# Altium footprint library NX Module baseboard.PcbLib: 96 footprints (part 6 of 6)
Each footprint in its own frame and in the unit in brackets; x right, y up, seen from the top. Pads: shape width x height; smd on the part's side, far side on the other; paste and mask are expansions set on the pad; w line width, h text height; cw(c..) or ccw(c..) is an arc to the next point about the centre after c.
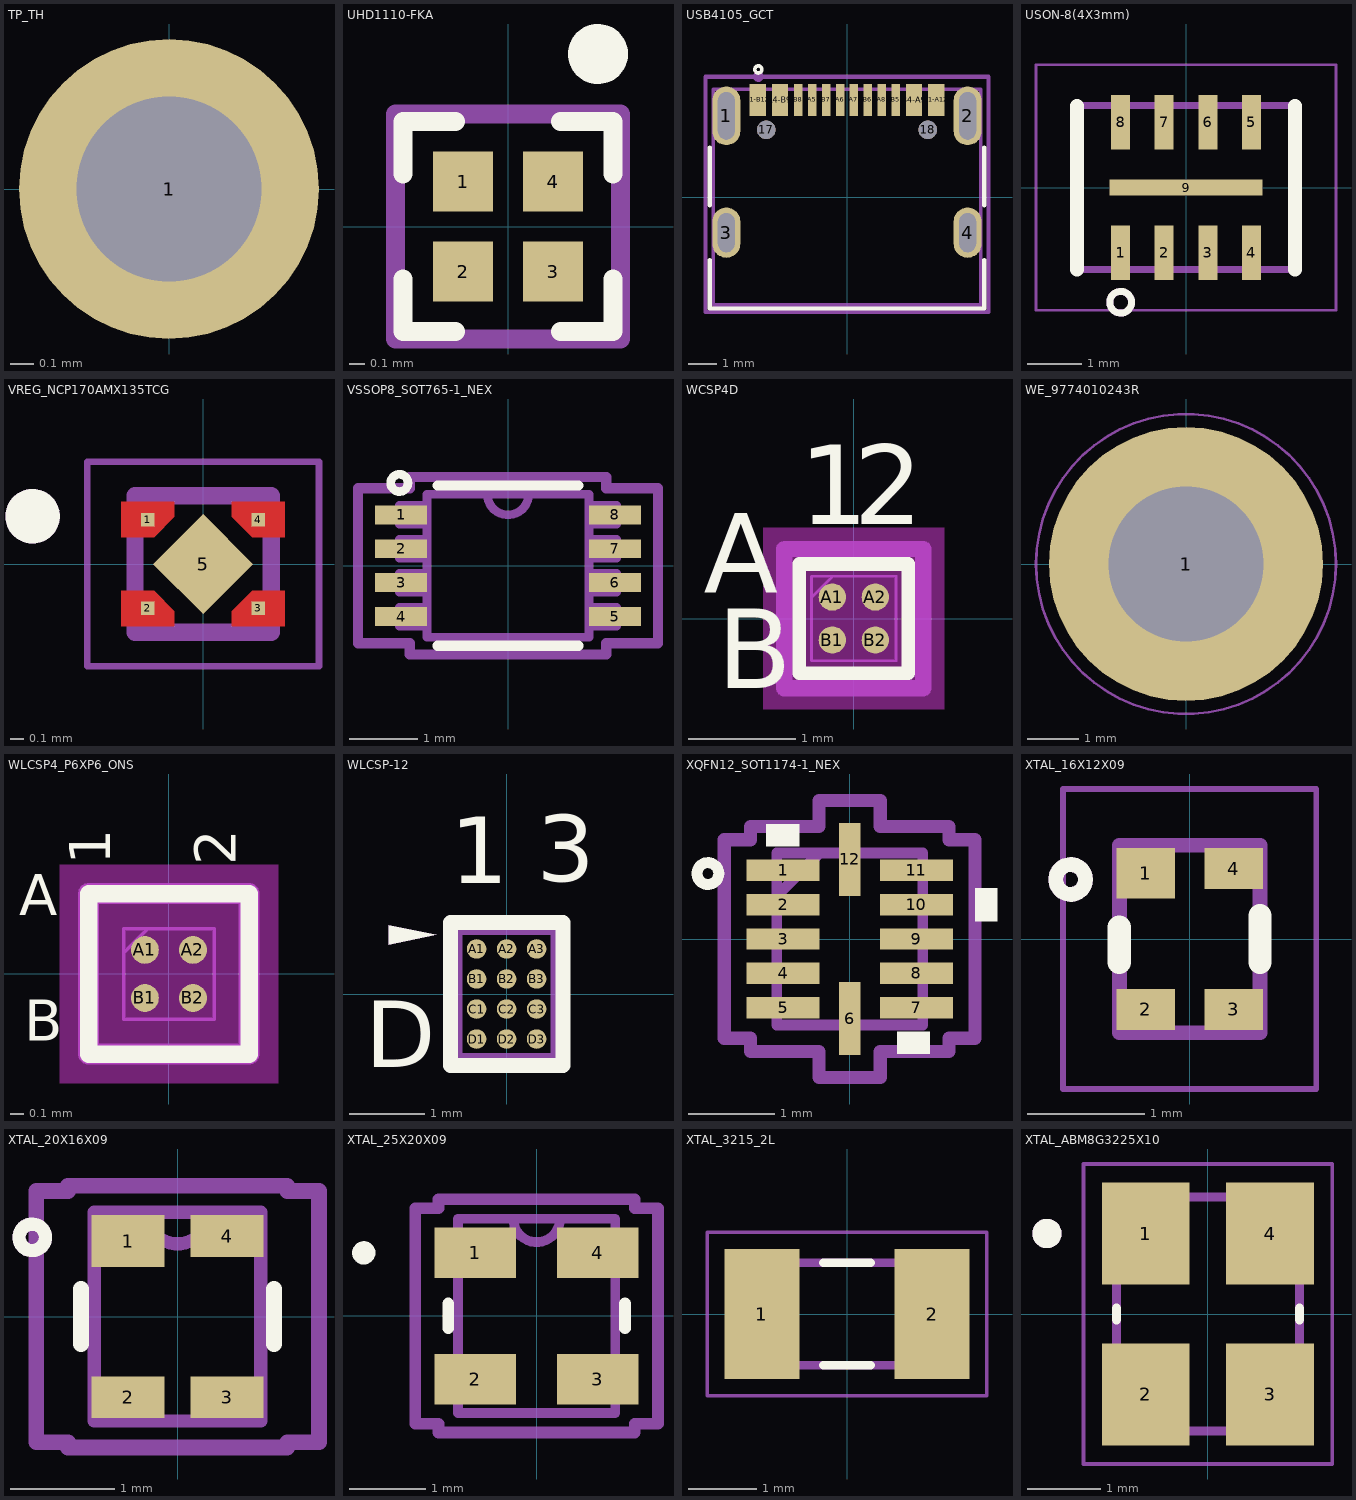
[diagram p5: the footprints below, top view; thin cyan lines are the x and y axes]

## TP_TH [mm] "1 mm Probe Pad"
pads (1):
  round 1.3 hole 0.8: 1(0,0)

## UHD1110-FKA [mm]
pads (4):
  rect 0.4x0.4 smd: 1(-0.3,0.3) 2(-0.3,-0.3) 3(0.3,-0.3) 4(0.3,0.3)
Top Overlay:
  circle w0.2: c0.6,1.15 r0.1
  lines w0.127: -0.7,-0.35 -0.7,-0.7 -0.35,-0.7 ; -0.7,0.35 -0.7,0.7 -0.35,0.7 ; 0.35,-0.7 0.7,-0.7 0.7,-0.35 ; 0.35,0.7 0.7,0.7 0.7,0.35
Mechanical 13:
  lines w0.127: -0.75,-0.75 -0.75,0.75 0.75,0.75 0.75,-0.75 -0.75,-0.75
  text ".Designator" at -0.55,-0.35 h1.27
3D body "UHD1110-FKA-CL1A13R3Q1BBQFMF3--3DModel-STEP-56544.STEP": height 0.7, standoff 0, extent -0.5,-0.5 0.5,0.5

## USB4105_GCT [mm]
pads (18):
  oval 1x2.1 hole 0.6 slot 1.7 at 90 deg mask+0.051: 1(-4.32,2.911) 2(4.32,2.911)
  oval 1x1.8 hole 0.6 slot 1.4 at 90 deg mask+0.051: 3(-4.32,-1.269) 4(4.32,-1.269)
  round 0.66 hole 0.66 unplated mask+0.051: 17(-2.89,2.411) 18(2.89,2.411)
  rect 0.584x1.143 smd mask+0.051: A1-B12(-3.2,3.486) A4-B9(-2.4,3.486) B1-A12(3.2,3.486) B4-A9(2.4,3.486)
  rect 0.305x1.143 smd paste+0 mask+0: A5(-1.25,3.486) A6(-0.25,3.486) A7(0.25,3.486) A8(1.25,3.486) B5(1.75,3.486) B6(0.75,3.486) B7(-0.75,3.486) B8(-1.75,3.486)
Top Overlay:
  circle w0.127: c-3.175,4.572 r0.127
  lines w0.152: -4.915,-2.252 -4.915,-3.988 4.915,-3.988 4.915,-2.252 ; -4.915,-0.287 -4.915,1.776 ; 4.915,-0.287 4.915,1.776
Mechanical 13:
  circle w0.127: c-3.175,4.318 r0.127
  lines w0.127: -4.788,-3.861 4.788,-3.861 4.788,3.861 -4.788,3.861 -4.788,-3.861
  text ".Designator" at -0.605,-0.232 h1.27
Mechanical 15:
  lines w0.152: -5.069,-4.115 -5.069,4.311 5.069,4.311 5.069,-4.115 -5.069,-4.115
Multi-Layer:
  lines w0.61: -4.32,-1.663 -4.32,-0.875 ; -4.32,2.365 -4.32,3.457 ; 4.32,-1.663 4.32,-0.875 ; 4.32,2.365 4.32,3.457
3D body "USB4105--3DModel-STEP-56544.STEP": height 3.31, standoff -0.85, extent -4.79,-3.861 4.79,3.849

## USON-8(4X3mm) [mm]
pads (9):
  rect 0.35x1 smd mask+0.05: 1(-1.2,-1.2) 2(-0.4,-1.2) 3(0.4,-1.2) 4(1.2,-1.2) 5(1.2,1.2) 6(0.4,1.2) 7(-0.4,1.2) 8(-1.2,1.2)
  rect 2.8x0.3 smd mask+0.05: 9(0,0)
Top Overlay:
  circle w0.127: c-1.197,-2.105 r0.2
  lines w0.254: -2,-1.5 -2,1.5 ; 2,-1.5 2,1.5
Mechanical 13:
  circle w0.127: c-1.199,-2.105 r0.199
  lines w0.127: -2,-1.5 -2,1.5 2,1.5 2,-1.5 -2,-1.5
  text ".Designator" at -0.632,-0.311 h1.27
Mechanical 15:
  lines w0.05: -2.75,-2.25 -2.75,2.25 2.75,2.25 2.75,-2.25 -2.75,-2.25
3D body: height 0.6, standoff 0, extent -2,-1.5 2,1.5

## VREG_NCP170AMX135TCG [mm]
pads (5):
  rect 0.1x0.1 smd paste-1 mask+0: 1(-0.405,0.325) 2(-0.405,-0.325) 3(0.405,-0.325) 4(0.405,0.325)
  rect 0.52x0.52 smd rot 45 mask+0.051: 5(0,0)
Top Layer:
  region: -0.21,0.345 -0.36,0.195 -0.6,0.195 -0.6,0.455 -0.21,0.455
  region: -0.21,-0.345 -0.21,-0.455 -0.6,-0.455 -0.6,-0.195 -0.36,-0.195
  region: 0.6,-0.455 0.21,-0.455 0.21,-0.345 0.36,-0.195 0.6,-0.195
  region: 0.6,0.195 0.36,0.195 0.21,0.345 0.21,0.455 0.6,0.455
Top Overlay:
  circle w0.2: c-1.25,0.35 r0.1
Top Paste:
  region: -0.21,0.345 -0.36,0.195 -0.6,0.195 -0.6,0.455 -0.21,0.455
  region: -0.21,-0.345 -0.21,-0.455 -0.6,-0.455 -0.6,-0.195 -0.36,-0.195
  region: 0.6,-0.455 0.21,-0.455 0.21,-0.345 0.36,-0.195 0.6,-0.195
  region: 0.6,0.195 0.36,0.195 0.21,0.345 0.21,0.455 0.6,0.455
Top Solder:
  region: 0.635,-0.483 0.178,-0.483 0.178,-0.33 0.356,-0.152 0.635,-0.152
  region: -0.178,-0.33 -0.178,-0.483 -0.635,-0.483 -0.635,-0.152 -0.356,-0.152
  region: -0.178,0.33 -0.356,0.152 -0.635,0.152 -0.635,0.483 -0.178,0.483
  region: 0.635,0.145 0.363,0.145 0.178,0.33 0.178,0.483 0.635,0.483
Mechanical 13:
  circle w0.2: c-1.25,0.35 r0.1
  lines w0.127: -0.5,-0.5 -0.5,0.5 0.5,0.5 0.5,-0.5 -0.5,-0.5
  text ".Designator" at -0.084,-0.429 h1.27
Mechanical 15:
  lines w0.05: -0.85,-0.75 0.85,-0.75 0.85,0.75 -0.85,0.75 -0.85,-0.75
3D body "step_temp.STEP": height 0.38, standoff -0.05, extent -0.5,-0.5 0.5,0.5

## VSSOP8_SOT765-1_NEX [mil]
pads (8):
  rect 30x11 smd paste+0 mask+0: 1(-62,29.53) 2(-62,9.84) 3(-62,-9.84) 4(-62,-29.53) 5(62,-29.53) 6(62,-9.84) 7(62,9.84) 8(62,29.53)
Top Overlay:
  circle w5: c-63,48 r5
  lines w6: -40.68,-46.5 40.68,-46.5 ; -40.68,46.5 40.68,46.5
Mechanical 13:
  lines w5: -12,41.5 ccw(c0,41.5) 12,41.5 ; -63,-35.03 -63,-24.03 -47,-24.03 -47,-35.03 -63,-35.03 ; -63,-15.34 -63,-4.34 -47,-4.34 -47,-15.34 -63,-15.34 ; -63,4.34 -63,15.34 -47,15.34 -47,4.34 -63,4.34 ; -63,24.03 -63,35.03 -47,35.03 -47,24.03 -63,24.03 ; -47,-41.5 47,-41.5 47,41.5 -47,41.5 -47,-41.5 ; 47,-35.03 47,-24.03 63,-24.03 63,-35.03 47,-35.03 ; 47,-15.34 47,-4.34 63,-4.34 63,-15.34 47,-15.34 ; 47,4.34 47,15.34 63,15.34 63,4.34 47,4.34 ; 47,24.03 47,35.03 63,35.03 63,24.03 47,24.03
  text ".Designator" at -18.43,-16.71 h50
Mechanical 15:
  lines w6: -87,-45.03 -87,45.03 -57,45.03 -57,51.5 57,51.5 57,45.03 87,45.03 87,-45.03 57,-45.03 57,-51.5 -57,-51.5 -57,-45.03 -87,-45.03
3D body "VSSOP8_SOT765-1_NEX.step": height 39.09, standoff 0, extent -62.99,-41.5 62.99,41.5

## WCSP4D [mm]
pads (4):
  round 0.254 smd paste+0 mask+0: A1(-0.2,0.2) A2(0.2,0.2) B1(-0.2,-0.2) B2(0.2,-0.2)
Top Overlay:
  lines w0.127: -0.508,-0.508 0.508,-0.508 0.508,0.508 -0.508,0.508 -0.508,-0.508
  text "2" at 0,0.635 h1.27
  text "1" at -0.508,0.635 h1.27
  text "B" at -1.27,-0.889 h1.27
  text "A" at -1.397,0 h1.27
Bottom Overlay:
  text "2" at 0.648,0.648 h1.27
  text "1" at -0.254,0.635 h1.27
  text "B" at -0.762,-0.889 h1.27
  text "A" at -0.648,0 h1.27
Keep-Out Layer:
  region: -0.844,-0.844 -0.844,0.844 0.844,0.844 0.844,-0.844
Mechanical 13:
  lines w0.025: -0.394,0.194 -0.194,0.394 ; -0.394,-0.394 -0.394,0.394 0.394,0.394 0.394,-0.394 -0.394,-0.394
  text "2" at 0,0.762 h1.27
  text "1" at -0.508,0.762 h1.27
  text "B" at -1.27,-0.762 h1.27
  text "A" at -1.397,0.127 h1.27
  text ".Designator" at -0.889,-1.874 h1.52
Mechanical 15:
  lines w0.152: -0.648,-0.648 0.648,-0.648 0.648,0.648 -0.648,0.648 -0.648,-0.648
3D body "WCSP4D.STEP": height 0.55, standoff 0, extent -0.395,-0.395 0.395,0.395

## WE_9774010243R [mm]
pads (2):
  round 5.3 smd paste-4: 1(0,0)
  round 3 hole 3 unplated: ""(0,0)
Top Paste:
  drawing of 4 lines, arcs and shapes, not listed
Mechanical 13:
  circle w0.127: c0,0 r2.175
  text ".Designator" at -0.354,-0.15 h0.3
Mechanical 15:
  circle w0.05: c0,0 r2.9
3D body "9774010243R (rev1).stp": height 1.1, standoff -1.3, extent -2.175,-2.172 2.175,2.172

## WLCSP4_P6XP6_ONS [mm]
pads (4):
  round 0.203 smd paste+0 mask+0: A1(-0.175,0.175) A2(0.175,0.175) B1(-0.175,-0.175) B2(0.175,-0.175)
Top Overlay:
  lines w0.127: -0.584,-0.584 0.584,-0.584 0.584,0.584 -0.584,0.584 -0.584,-0.584
  text "A" at -1.091,0.33 h0.51
  text "B" at -1.054,-0.584 h0.51
  text "1" at -0.33,0.795 h0.51
  text "2" at 0.584,0.792 h0.51
Keep-Out Layer:
  region: -0.794,-0.794 -0.794,0.794 0.794,0.794 0.794,-0.794
Mechanical 13:
  lines w0.025: -0.33,0.155 -0.155,0.33 ; -0.33,-0.33 0.33,-0.33 0.33,0.33 -0.33,0.33 -0.33,-0.33
  text ".Designator" at -0.254,-0.159 h0.51
  text "A" at -0.762,0.127 h0.51
  text "B" at -0.762,-0.381 h0.51
  text "1" at -0.127,0.635 h0.51
  text "2" at 0.381,0.635 h0.51
Mechanical 15:
  lines w0.152: -0.584,-0.584 -0.584,0.584 0.584,0.584 0.584,-0.584 -0.584,-0.584
3D body: height 0.33, standoff 0, extent -0.33,-0.33 0.33,0.33

## WLCSP-12 [mm]
pads (12):
  round 0.26 smd mask+0.025: A1(-0.4,0.6) A2(0,0.6) A3(0.4,0.6) B1(-0.4,0.2) B2(0,0.2) B3(0.4,0.2) C1(-0.4,-0.2) C2(0,-0.2) C3(0.4,-0.2) D1(-0.4,-0.6) D2(0,-0.6) D3(0.4,-0.6)
Top Overlay:
  region: -0.938,0.787 -1.573,0.914 -1.573,0.66
  lines w0.2: -0.75,-0.95 0.75,-0.95 0.75,0.95 -0.75,0.95 -0.75,-0.95
  text "D" at -1.887,-1.266 h1.52
  text "1" at -0.75,1.186 h1.52
  text "3" at 0.4,1.208 h1.52
Mechanical 13:
  region: -0.938,0.787 -1.573,0.914 -1.573,0.66
  lines w0.127: -0.65,-0.85 0.65,-0.85 0.65,0.85 -0.65,0.85 -0.65,-0.85
  text ".Designator" at 0.381,-0.33 h1.27
  text "1" at -0.853,1.186 h1.52
  text "3" at 0.297,1.208 h1.52
  text "D" at -1.99,-1.266 h1.52
3D body: height 0.63, standoff 0, extent -0.65,-0.85 0.65,0.85

## XQFN12_SOT1174-1_NEX [mm]
pads (12):
  rect 0.85x0.25 smd paste+0 mask+0.051: 1(-0.775,0.8) 2(-0.775,0.4) 3(-0.775,0) 4(-0.775,-0.4) 5(-0.775,-0.8) 7(0.775,-0.8) 8(0.775,-0.4) 9(0.775,0) 10(0.775,0.4) 11(0.775,0.8)
  rect 0.25x0.85 smd paste+0 mask+0.051: 6(0,-0.927) 12(0,0.927)
Top Overlay:
  circle w0.127: c-1.651,0.762 r0.127
  region: 1.46,0.59 1.714,0.59 1.714,0.209 1.46,0.209
  region: -0.971,1.079 -0.971,1.333 -0.59,1.333 -0.59,1.079
  region: 0.553,-1.333 0.553,-1.079 0.934,-1.079 0.934,-1.333
Mechanical 13:
  lines w0.127: -0.85,0.5 -0.35,1 ; -0.85,-1 -0.85,1 0.85,1 0.85,-1 -0.85,-1
  text ".Designator" at -0.508,-0.381 h1.27
Mechanical 15:
  lines w0.152: -1.46,-1.156 -1.46,1.156 -1.156,1.156 -1.156,1.308 -0.356,1.308 -0.356,1.613 0.356,1.613 0.356,1.308 1.156,1.308 1.156,1.156 1.46,1.156 1.46,-1.156 1.156,-1.156 1.156,-1.308 0.356,-1.308 0.356,-1.613 -0.356,-1.613 -0.356,-1.308 -1.156,-1.308 -1.156,-1.156 -1.46,-1.156
3D body "XQFN12_SOT1174-1_NEX.step": height 0.51, standoff 0, extent -0.902,-1.054 0.902,1.054

## XTAL_16X12X09 [mm]
pads (4):
  rect 0.5x0.43 smd mask+0.05: 1(-0.375,0.56)
  rect 0.5x0.35 smd mask+0.05: 2(-0.375,-0.6) 3(0.375,-0.6) 4(0.375,0.6)
Top Overlay:
  circle w0.127: c-1.016,0.508 r0.127
  lines w0.2: -0.6,-0.2 -0.6,0.1 ; 0.6,-0.2 0.6,0.2
Mechanical 13:
  circle w0.127: c-1.016,0.508 r0.127
  lines w0.127: -0.6,-0.8 0.6,-0.8 0.6,0.8 -0.6,0.8 -0.6,-0.8
  text ".Designator" at 0,-0.381 h1.27
Mechanical 15:
  lines w0.05: -1.08,-1.28 1.08,-1.28 1.08,1.28 -1.08,1.28 -1.08,-1.28
3D body "AMPMGFB-26.0000T.stp": height 0.99, standoff 0, extent -0.6,-0.8 0.6,0.8

## XTAL_20X16X09 [mm]
pads (4):
  rect 0.7x0.5 smd paste+0 mask+0.05: 1(-0.475,0.725)
  rect 0.7x0.4 smd paste+0 mask+0.05: 2(-0.475,-0.775) 3(0.475,-0.775) 4(0.475,0.775)
Top Overlay:
  circle w0.127: c-1.397,0.762 r0.127
  lines w0.152: -0.927,-0.264 -0.927,0.264 ; 0.927,-0.264 0.927,0.264
Mechanical 13:
  circle w0.127: c-1.397,0.762 r0.127
  lines w0.127: -0.305,1.003 ccw(c0,1.003) 0.305,1.003 ; -0.8,-1.003 0.8,-1.003 0.8,1.003 -0.8,1.003 -0.8,-1.003
  text ".Designator" at -0.139,-0.319 h1.27
Mechanical 15:
  lines w0.152: -1.359,-1.206 -1.359,1.206 -1.054,1.206 -1.054,1.257 1.054,1.257 1.054,1.206 1.359,1.206 1.359,-1.206 1.054,-1.206 1.054,-1.257 -1.054,-1.257 -1.054,-1.206 -1.359,-1.206
3D body: height 0.25, standoff 0, extent 0,0 0.254,0.254
3D body "AMPMAFB-12.0000T.stp": height 0.99, standoff 0, extent -0.8,-1 0.8,1

## XTAL_25X20X09 [mil]
pads (4):
  rect 42x26 smd paste+0 mask+0: 1(-31.5,32.48) 2(-31.5,-32.48) 3(31.5,-32.48) 4(31.5,32.48)
Top Overlay:
  circle w6: c-88.98,32.48 r3
  lines w6: -45.5,-6.38 -45.5,6.38 ; 45.5,-6.38 45.5,6.38
Mechanical 13:
  lines w5: -12,50 ccw(c0,50) 12,50 ; -40.5,-50 -40.5,50 40.5,50 40.5,-50 -40.5,-50
  text ".Designator" at -7.46,-14.21 h50
Mechanical 15:
  lines w6: -62.5,-55.48 -50.5,-55.48 -50.5,-60 50.5,-60 50.5,-55.48 62.5,-55.48 62.5,55.48 50.5,55.48 50.5,60 -50.5,60 -50.5,55.48 -62.5,55.48 -62.5,-55.48
3D body "CDFN4_2P5X2_MCH.step": height 35.12, standoff 0, extent -40.51,-50 40.52,50

## XTAL_3215_2L [mm]
pads (2):
  rect 1.1x1.9 smd: 1(-1.25,0) 2(1.25,0)
Top Overlay:
  lines w0.127: -0.35,-0.75 0.35,-0.75 ; -0.35,0.75 0.35,0.75
Mechanical 13:
  lines w0.127: -1.6,-0.75 -1.6,0.75 ; -1.6,-0.75 1.6,-0.75 ; -1.6,-0.75 1.6,-0.75 ; -1.6,-0.75 -1.6,0.75 ; -1.6,0.75 1.6,0.75 ; -1.6,0.75 1.6,0.75 ; 1.6,-0.75 1.6,0.75 ; 1.6,-0.75 1.6,0.75
  text ".Designator" at -1.295,-0.508 h1.27
Mechanical 15:
  lines w0.05: -2.05,-1.2 -2.05,1.2 2.05,1.2 2.05,-1.2 -2.05,-1.2
3D body "User Library-Crystal FC-135.STEP": height 0.8, standoff 0, extent -1.6,-0.75 1.6,0.75

## XTAL_ABM8G3225X10 [mm]
height 1
pads (4):
  rect 1.2x1.4 smd: 1(-0.85,1.1) 2(-0.85,-1.1) 3(0.85,-1.1) 4(0.85,1.1)
Top Overlay:
  circle w0.2: c-2.2,1.1 r0.1
  lines w0.127: -1.25,-0.08 -1.25,0.08 ; 1.25,-0.08 1.25,0.08
Mechanical 13:
  circle w0.2: c-2.2,1.1 r0.1
  lines w0.127: -1.25,-1.6 -1.25,1.6 1.25,1.6 1.25,-1.6 -1.25,-1.6
  text ".Designator" at -0.663,-0.364 h1.27
Mechanical 15:
  lines w0.05: -1.7,-2.05 -1.7,2.05 1.7,2.05 1.7,-2.05 -1.7,-2.05
3D body "step_temp.STEP": height 0.99, standoff 0, extent -1.245,-1.6 1.245,1.6